# Altium footprint library 1.27MM_母座.PcbLib: 37 footprints (part 3 of 3)
Each footprint in its own frame and in the unit in brackets; x right, y up, seen from the top. Pads: shape width x height; smd on the part's side, far side on the other; paste and mask are expansions set on the pad; w line width, h text height; cw(c..) or ccw(c..) is an arc to the next point about the centre after c.
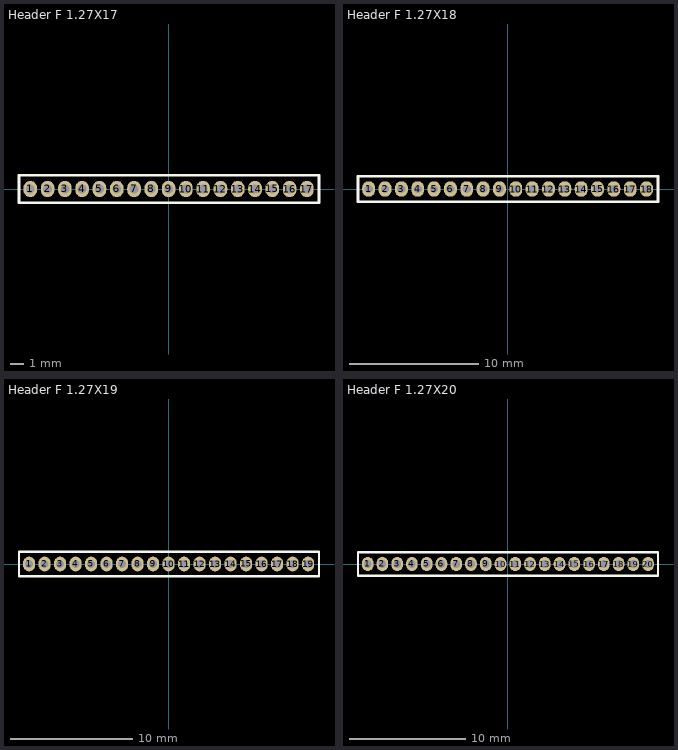
[diagram p2: the footprints below, top view; thin cyan lines are the x and y axes]

## Header F 1.27X17 [mm]
pads (17):
  oval 1x1.2 hole 0.65: 1(-10.16,0) 2(-8.89,0) 3(-7.62,0) 4(-6.35,0) 5(-5.08,0) 6(-3.81,0) 7(-2.54,0) 8(-1.27,0) 9(0,0) 10(1.27,0) 11(2.54,0) 12(3.81,0) 13(5.08,0) 14(6.35,0) 15(7.62,0) 16(8.89,0) 17(10.16,0)
Top Overlay:
  lines w0.2: -10.99,-1 -10.99,1 11.05,1 11.05,-1 -10.99,-1
Mechanical 15:
  lines w0.1: -10.99,-1 11.05,-1 11.05,1 -10.99,1 -10.99,-1
3D body "Header-F-1.27X17.stp": height 3.4, standoff -2.4, extent -10.995,-0.9 10.995,0.9

## Header F 1.27X18 [mm]
pads (18):
  oval 1x1.2 hole 0.65: 1(-10.795,0) 2(-9.525,0) 3(-8.255,0) 4(-6.985,0) 5(-5.715,0) 6(-4.445,0) 7(-3.175,0) 8(-1.905,0) 9(-0.635,0) 10(0.635,0) 11(1.905,0) 12(3.175,0) 13(4.445,0) 14(5.715,0) 15(6.985,0) 16(8.255,0) 17(9.525,0) 18(10.795,0)
Top Overlay:
  lines w0.2: -11.625,-1 11.685,-1 11.685,1 -11.625,1 -11.625,-1
Mechanical 15:
  lines w0.1: -11.625,-1 -11.625,1 11.685,1 11.685,-1 -11.625,-1
3D body "Header-F-1.27X18.stp": height 3.4, standoff -2.4, extent -11.63,-0.9 11.63,0.9

## Header F 1.27X19 [mm]
pads (19):
  oval 1x1.2 hole 0.65: 1(-11.43,0) 2(-10.16,0) 3(-8.89,0) 4(-7.62,0) 5(-6.35,0) 6(-5.08,0) 7(-3.81,0) 8(-2.54,0) 9(-1.27,0) 10(0,0) 11(1.27,0) 12(2.54,0) 13(3.81,0) 14(5.08,0) 15(6.35,0) 16(7.62,0) 17(8.89,0) 18(10.16,0) 19(11.43,0)
Top Overlay:
  lines w0.2: -12.26,-1 12.32,-1 12.32,1 -12.26,1 -12.26,-1
Mechanical 15:
  lines w0.1: -12.26,-1 -12.26,1 12.32,1 12.32,-1 -12.26,-1
3D body "Header-F-1.27X19.stp": height 3.4, standoff -2.4, extent -12.265,-0.9 12.265,0.9

## Header F 1.27X20 [mm]
pads (20):
  oval 1x1.2 hole 0.65: 1(-12.065,0) 2(-10.795,0) 3(-9.525,0) 4(-8.255,0) 5(-6.985,0) 6(-5.715,0) 7(-4.445,0) 8(-3.175,0) 9(-1.905,0) 10(-0.635,0) 11(0.635,0) 12(1.905,0) 13(3.175,0) 14(4.445,0) 15(5.715,0) 16(6.985,0) 17(8.255,0) 18(9.525,0) 19(10.795,0) 20(12.065,0)
Top Overlay:
  lines w0.2: -12.895,-1 -12.895,1 12.915,1 12.915,-1 -12.895,-1
Mechanical 15:
  lines w0.1: -12.895,-1 12.915,-1 12.915,1 -12.895,1 -12.895,-1
3D body "Header-F-1.27X20.stp": height 3.4, standoff -2.4, extent -12.9,-0.9 12.9,0.9

## PCBComponent_1 [mm]